# Altium schematic symbol library Regulator_Switching.SchLib: 1120 symbols (part 7 of 8)
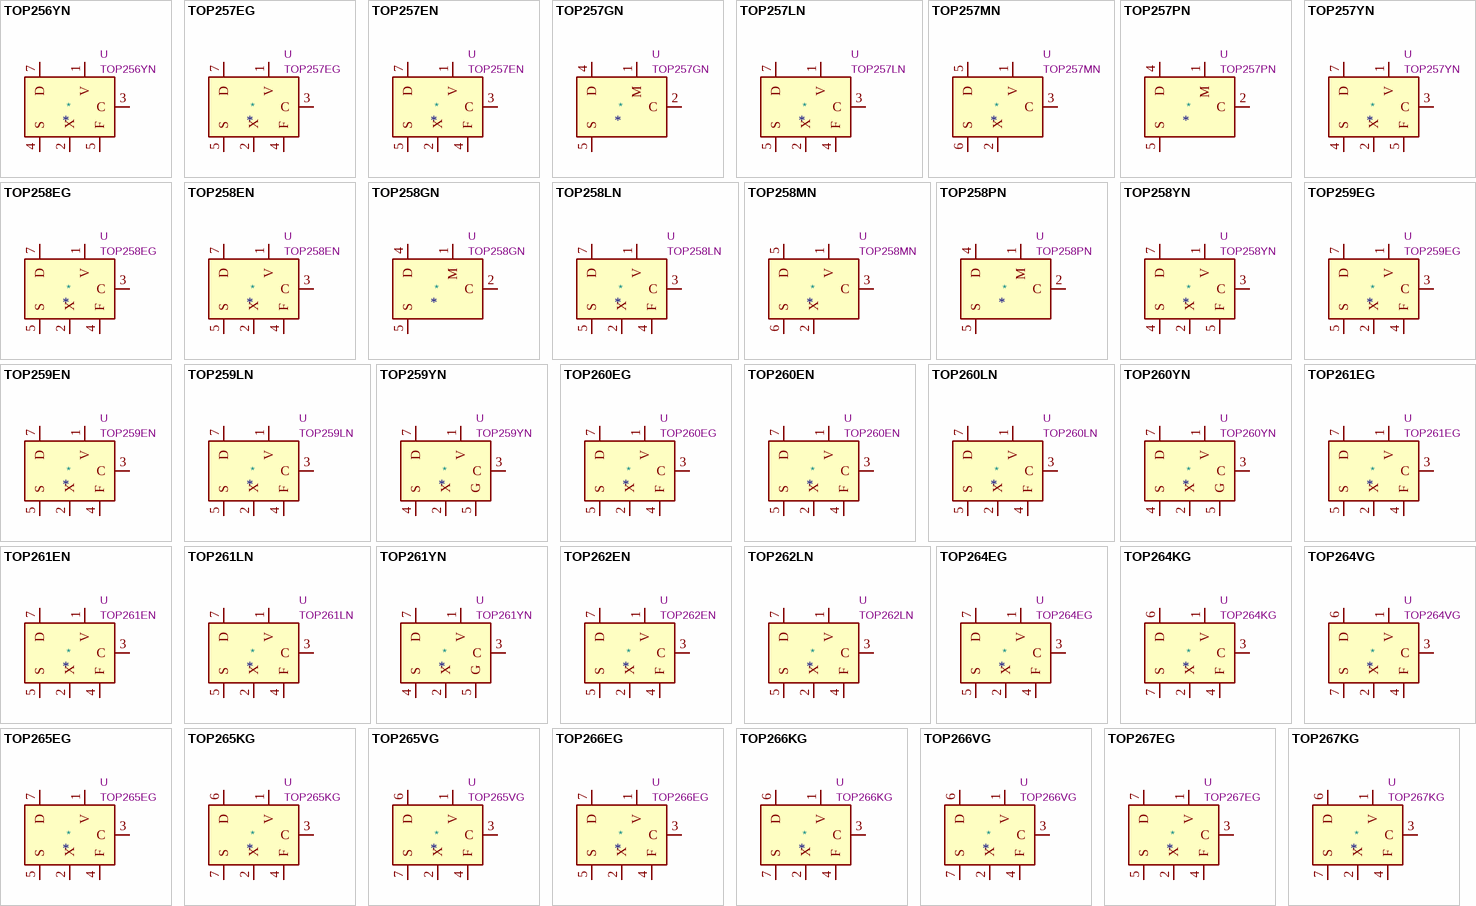
[diagram p33: symbols TOP256YN to TOP267KG]

## TOP256YN
designator *  value TOP256YN  Reference: U
ki_keywords: Eco Smart Off-Line Switcher, Extendend Power Range; ki_description: TOPSwitch-HX Family, 86W Output Power; ki_fp_filters: PowerIntegrations*TO?220?7C*; Footprint: Package_TO_SOT_THT:PowerIntegrations_TO-220-7C; Datasheet: https://ac-dc.power.com/sites/default/files/product-docs/topswitch-hx_family_datasheet.pdf
pins: 1 V, 2 X, 3 C, 4 S, 5 F, 7 D

## TOP257EG
designator *  value TOP257EG  Reference: U
ki_keywords: Eco Smart Off-Line Switcher, Extendend Power Range; ki_description: TOPSwitch-HX Family, 119W Output Power; ki_fp_filters: PowerIntegrations?eSIP?7C*; Footprint: Package_SIP:PowerIntegrations_eSIP-7C; Datasheet: https://ac-dc.power.com/sites/default/files/product-docs/topswitch-hx_family_datasheet.pdf
pins: 1 V, 2 X, 3 C, 4 F, 5 S, 7 D

## TOP257EN
designator *  value TOP257EN  Reference: U
ki_keywords: Eco Smart Off-Line Switcher, Extendend Power Range; ki_description: TOPSwitch-HX Family, 119W Output Power; ki_fp_filters: PowerIntegrations?eSIP?7C*; Footprint: Package_SIP:PowerIntegrations_eSIP-7C; Datasheet: https://ac-dc.power.com/sites/default/files/product-docs/topswitch-hx_family_datasheet.pdf
pins: 1 V, 2 X, 3 C, 4 F, 5 S, 7 D

## TOP257GN
designator *  value TOP257GN  Reference: U
ki_keywords: Eco Smart Off-Line Switcher, Extendend Power Range; ki_description: TOPSwitch-HX Family, 30W Output Power; ki_fp_filters: PowerIntegrations?SMD?8C*; Footprint: Package_DIP:PowerIntegrations_SMD-8C; Datasheet: https://ac-dc.power.com/sites/default/files/product-docs/topswitch-hx_family_datasheet.pdf
pins: 1 M, 2 C, 4 D, 5 S, 6 S hidden, 7 S hidden, 8 S hidden

## TOP257LN
designator *  value TOP257LN  Reference: U
ki_keywords: Eco Smart Off-Line Switcher, Extendend Power Range; ki_description: TOPSwitch-HX Family, 78W Output Power; ki_fp_filters: PowerIntegrations?eSIP?7F*; Footprint: Package_SIP:PowerIntegrations_eSIP-7F; Datasheet: https://ac-dc.power.com/sites/default/files/product-docs/topswitch-hx_family_datasheet.pdf
pins: 1 V, 2 X, 3 C, 4 F, 5 S, 7 D

## TOP257MN
designator *  value TOP257MN  Reference: U
ki_keywords: Eco Smart Off-Line Switcher, Extendend Power Range; ki_description: TOPSwitch-HX Family, 30W Output Power; ki_fp_filters: PowerIntegrations?SDIP?10C*; Footprint: Package_DIP:PowerIntegrations_SDIP-10C; Datasheet: https://ac-dc.power.com/sites/default/files/product-docs/topswitch-hx_family_datasheet.pdf
pins: 1 V, 2 X, 3 C, 5 D, 6 S, 7 S hidden, 8 S hidden, 9 S hidden, 10 S hidden

## TOP257PN
designator *  value TOP257PN  Reference: U
ki_keywords: Eco Smart Off-Line Switcher, Extendend Power Range; ki_description: TOPSwitch-HX Family, 30W Output Power; ki_fp_filters: PowerIntegrations?PDIP?8C*; Footprint: Package_DIP:PowerIntegrations_PDIP-8C; Datasheet: https://ac-dc.power.com/sites/default/files/product-docs/topswitch-hx_family_datasheet.pdf
pins: 1 M, 2 C, 4 D, 5 S, 6 S hidden, 7 S hidden, 8 S hidden

## TOP257YN
designator *  value TOP257YN  Reference: U
ki_keywords: Eco Smart Off-Line Switcher, Extendend Power Range; ki_description: TOPSwitch-HX Family, 119W Output Power; ki_fp_filters: PowerIntegrations*TO?220?7C*; Footprint: Package_TO_SOT_THT:PowerIntegrations_TO-220-7C; Datasheet: https://ac-dc.power.com/sites/default/files/product-docs/topswitch-hx_family_datasheet.pdf
pins: 1 V, 2 X, 3 C, 4 S, 5 F, 7 D

## TOP258EG
designator *  value TOP258EG  Reference: U
ki_keywords: Eco Smart Off-Line Switcher, Extendend Power Range; ki_description: TOPSwitch-HX Family, 148W Output Power; ki_fp_filters: PowerIntegrations?eSIP?7C*; Footprint: Package_SIP:PowerIntegrations_eSIP-7C; Datasheet: https://ac-dc.power.com/sites/default/files/product-docs/topswitch-hx_family_datasheet.pdf
pins: 1 V, 2 X, 3 C, 4 F, 5 S, 7 D

## TOP258EN
designator *  value TOP258EN  Reference: U
ki_keywords: Eco Smart Off-Line Switcher, Extendend Power Range; ki_description: TOPSwitch-HX Family, 148W Output Power; ki_fp_filters: PowerIntegrations?eSIP?7C*; Footprint: Package_SIP:PowerIntegrations_eSIP-7C; Datasheet: https://ac-dc.power.com/sites/default/files/product-docs/topswitch-hx_family_datasheet.pdf
pins: 1 V, 2 X, 3 C, 4 F, 5 S, 7 D

## TOP258GN
designator *  value TOP258GN  Reference: U
ki_keywords: Eco Smart Off-Line Switcher, Extendend Power Range; ki_description: TOPSwitch-HX Family, 35W Output Power; ki_fp_filters: PowerIntegrations?SMD?8C*; Footprint: Package_DIP:PowerIntegrations_SMD-8C; Datasheet: https://ac-dc.power.com/sites/default/files/product-docs/topswitch-hx_family_datasheet.pdf
pins: 1 M, 2 C, 4 D, 5 S, 6 S hidden, 7 S hidden, 8 S hidden

## TOP258LN
designator *  value TOP258LN  Reference: U
ki_keywords: Eco Smart Off-Line Switcher, Extendend Power Range; ki_description: TOPSwitch-HX Family, 92W Output Power; ki_fp_filters: PowerIntegrations?eSIP?7F*; Footprint: Package_SIP:PowerIntegrations_eSIP-7F; Datasheet: https://ac-dc.power.com/sites/default/files/product-docs/topswitch-hx_family_datasheet.pdf
pins: 1 V, 2 X, 3 C, 4 F, 5 S, 7 D

## TOP258MN
designator *  value TOP258MN  Reference: U
ki_keywords: Eco Smart Off-Line Switcher, Extendend Power Range; ki_description: TOPSwitch-HX Family, 35W Output Power; ki_fp_filters: PowerIntegrations?SDIP?10C*; Footprint: Package_DIP:PowerIntegrations_SDIP-10C; Datasheet: https://ac-dc.power.com/sites/default/files/product-docs/topswitch-hx_family_datasheet.pdf
pins: 1 V, 2 X, 3 C, 5 D, 6 S, 7 S hidden, 8 S hidden, 9 S hidden, 10 S hidden

## TOP258PN
designator *  value TOP258PN  Reference: U
ki_keywords: Eco Smart Off-Line Switcher, Extendend Power Range; ki_description: TOPSwitch-HX Family, 35W Output Power; ki_fp_filters: PowerIntegrations?PDIP?8C*; Footprint: Package_DIP:PowerIntegrations_PDIP-8C; Datasheet: https://ac-dc.power.com/sites/default/files/product-docs/topswitch-hx_family_datasheet.pdf
pins: 1 M, 2 C, 4 D, 5 S, 6 S hidden, 7 S hidden, 8 S hidden

## TOP258YN
designator *  value TOP258YN  Reference: U
ki_keywords: Eco Smart Off-Line Switcher, Extendend Power Range; ki_description: TOPSwitch-HX Family, 148W Output Power; ki_fp_filters: PowerIntegrations*TO?220?7C*; Footprint: Package_TO_SOT_THT:PowerIntegrations_TO-220-7C; Datasheet: https://ac-dc.power.com/sites/default/files/product-docs/topswitch-hx_family_datasheet.pdf
pins: 1 V, 2 X, 3 C, 4 S, 5 F, 7 D

## TOP259EG
designator *  value TOP259EG  Reference: U
ki_keywords: Eco Smart Off-Line Switcher, Extendend Power Range; ki_description: TOPSwitch-HX Family, 171W Output Power; ki_fp_filters: PowerIntegrations?eSIP?7C*; Footprint: Package_SIP:PowerIntegrations_eSIP-7C; Datasheet: https://ac-dc.power.com/sites/default/files/product-docs/topswitch-hx_family_datasheet.pdf
pins: 1 V, 2 X, 3 C, 4 F, 5 S, 7 D

## TOP259EN
designator *  value TOP259EN  Reference: U
ki_keywords: Eco Smart Off-Line Switcher, Extendend Power Range; ki_description: TOPSwitch-HX Family, 171W Output Power; ki_fp_filters: PowerIntegrations?eSIP?7C*; Footprint: Package_SIP:PowerIntegrations_eSIP-7C; Datasheet: https://ac-dc.power.com/sites/default/files/product-docs/topswitch-hx_family_datasheet.pdf
pins: 1 V, 2 X, 3 C, 4 F, 5 S, 7 D

## TOP259LN
designator *  value TOP259LN  Reference: U
ki_keywords: Eco Smart Off-Line Switcher, Extendend Power Range; ki_description: TOPSwitch-HX Family, 120W Output Power; ki_fp_filters: PowerIntegrations?eSIP?7F*; Footprint: Package_SIP:PowerIntegrations_eSIP-7F; Datasheet: https://ac-dc.power.com/sites/default/files/product-docs/topswitch-hx_family_datasheet.pdf
pins: 1 V, 2 X, 3 C, 4 F, 5 S, 7 D

## TOP259YN
designator *  value TOP259YN  Reference: U
ki_keywords: Eco Smart Off-Line Switcher, Extendend Power Range; ki_description: TOPSwitch-HX Family, 171W Output Power; ki_fp_filters: PowerIntegrations*TO?220?7C*; Footprint: Package_TO_SOT_THT:PowerIntegrations_TO-220-7C; Datasheet: https://ac-dc.power.com/sites/default/files/product-docs/topswitch-hx_family_datasheet.pdf
pins: 1 V, 2 X, 3 C, 4 S, 5 G, 7 D

## TOP260EG
designator *  value TOP260EG  Reference: U
ki_keywords: Eco Smart Off-Line Switcher, Extendend Power Range; ki_description: TOPSwitch-HX Family, 200W Output Power; ki_fp_filters: PowerIntegrations?eSIP?7C*; Footprint: Package_SIP:PowerIntegrations_eSIP-7C; Datasheet: https://ac-dc.power.com/sites/default/files/product-docs/topswitch-hx_family_datasheet.pdf
pins: 1 V, 2 X, 3 C, 4 F, 5 S, 7 D

## TOP260EN
designator *  value TOP260EN  Reference: U
ki_keywords: Eco Smart Off-Line Switcher, Extendend Power Range; ki_description: TOPSwitch-HX Family, 200W Output Power; ki_fp_filters: PowerIntegrations?eSIP?7C*; Footprint: Package_SIP:PowerIntegrations_eSIP-7C; Datasheet: https://ac-dc.power.com/sites/default/files/product-docs/topswitch-hx_family_datasheet.pdf
pins: 1 V, 2 X, 3 C, 4 F, 5 S, 7 D

## TOP260LN
designator *  value TOP260LN  Reference: U
ki_keywords: Eco Smart Off-Line Switcher, Extendend Power Range; ki_description: TOPSwitch-HX Family, 140W Output Power; ki_fp_filters: PowerIntegrations?eSIP?7F*; Footprint: Package_SIP:PowerIntegrations_eSIP-7F; Datasheet: https://ac-dc.power.com/sites/default/files/product-docs/topswitch-hx_family_datasheet.pdf
pins: 1 V, 2 X, 3 C, 4 F, 5 S, 7 D

## TOP260YN
designator *  value TOP260YN  Reference: U
ki_keywords: Eco Smart Off-Line Switcher, Extendend Power Range; ki_description: TOPSwitch-HX Family, 200W Output Power; ki_fp_filters: PowerIntegrations*TO?220?7C*; Footprint: Package_TO_SOT_THT:PowerIntegrations_TO-220-7C; Datasheet: https://ac-dc.power.com/sites/default/files/product-docs/topswitch-hx_family_datasheet.pdf
pins: 1 V, 2 X, 3 C, 4 S, 5 G, 7 D

## TOP261EG
designator *  value TOP261EG  Reference: U
ki_keywords: Eco Smart Off-Line Switcher, Extendend Power Range; ki_description: TOPSwitch-HX Family, 254W Output Power; ki_fp_filters: PowerIntegrations?eSIP?7C*; Footprint: Package_SIP:PowerIntegrations_eSIP-7C; Datasheet: https://ac-dc.power.com/sites/default/files/product-docs/topswitch-hx_family_datasheet.pdf
pins: 1 V, 2 X, 3 C, 4 F, 5 S, 7 D

## TOP261EN
designator *  value TOP261EN  Reference: U
ki_keywords: Eco Smart Off-Line Switcher, Extendend Power Range; ki_description: TOPSwitch-HX Family, 254W Output Power; ki_fp_filters: PowerIntegrations?eSIP?7C*; Footprint: Package_SIP:PowerIntegrations_eSIP-7C; Datasheet: https://ac-dc.power.com/sites/default/files/product-docs/topswitch-hx_family_datasheet.pdf
pins: 1 V, 2 X, 3 C, 4 F, 5 S, 7 D

## TOP261LN
designator *  value TOP261LN  Reference: U
ki_keywords: Eco Smart Off-Line Switcher, Extendend Power Range; ki_description: TOPSwitch-HX Family, 177W Output Power; ki_fp_filters: PowerIntegrations?eSIP?7F*; Footprint: Package_SIP:PowerIntegrations_eSIP-7F; Datasheet: https://ac-dc.power.com/sites/default/files/product-docs/topswitch-hx_family_datasheet.pdf
pins: 1 V, 2 X, 3 C, 4 F, 5 S, 7 D

## TOP261YN
designator *  value TOP261YN  Reference: U
ki_keywords: Eco Smart Off-Line Switcher, Extendend Power Range; ki_description: TOPSwitch-HX Family, 254W Output Power; ki_fp_filters: PowerIntegrations*TO?220?7C*; Footprint: Package_TO_SOT_THT:PowerIntegrations_TO-220-7C; Datasheet: https://ac-dc.power.com/sites/default/files/product-docs/topswitch-hx_family_datasheet.pdf
pins: 1 V, 2 X, 3 C, 4 S, 5 G, 7 D

## TOP262EN
designator *  value TOP262EN  Reference: U
ki_keywords: Eco Smart Off-Line Switcher, Extendend Power Range; ki_description: TOPSwitch-HX Family, 254W Output Power; ki_fp_filters: PowerIntegrations?eSIP?7C*; Footprint: Package_SIP:PowerIntegrations_eSIP-7C; Datasheet: https://ac-dc.power.com/sites/default/files/product-docs/topswitch-hx_family_datasheet.pdf
pins: 1 V, 2 X, 3 C, 4 F, 5 S, 7 D

## TOP262LN
designator *  value TOP262LN  Reference: U
ki_keywords: Eco Smart Off-Line Switcher, Extendend Power Range; ki_description: TOPSwitch-HX Family, 177W Output Power; ki_fp_filters: PowerIntegrations?eSIP?7F*; Footprint: Package_SIP:PowerIntegrations_eSIP-7F; Datasheet: https://ac-dc.power.com/sites/default/files/product-docs/topswitch-hx_family_datasheet.pdf
pins: 1 V, 2 X, 3 C, 4 F, 5 S, 7 D

## TOP264EG
designator *  value TOP264EG  Reference: U
ki_keywords: Integrated Off-Line Switcher with EcoSmart™ Technology; ki_description: TOPSwitch-JX Family, 43W Output Power, eSIP-7C; ki_fp_filters: PowerIntegrations?eSIP?7C*; Footprint: Package_SIP:PowerIntegrations_eSIP-7C; Datasheet: https://ac-dc.power.com/sites/default/files/product-docs/topswitch-jx_family_datasheet.pdf
pins: 1 V, 2 X, 3 C, 4 F, 5 S, 7 D

## TOP264KG
designator *  value TOP264KG  Reference: U
ki_keywords: Integrated Off-Line Switcher with EcoSmart™ Technology; ki_description: TOPSwitch-JX Family, 30W Output Power, eSOP-12B; ki_fp_filters: PowerIntegrations?eSOP?12B*; Footprint: Package_SO:PowerIntegrations_eSOP-12B; Datasheet: https://ac-dc.power.com/sites/default/files/product-docs/topswitch-jx_family_datasheet.pdf
pins: 1 V, 2 X, 3 C, 4 F, 6 D, 7 S, 8 S hidden, 9 S hidden, 10 S hidden, 11 S hidden, 12 S hidden

## TOP264VG
designator *  value TOP264VG  Reference: U
ki_keywords: Integrated Off-Line Switcher with EcoSmart™ Technology; ki_description: TOPSwitch-JX Family, 43W Output Power, eDIP-12B; ki_fp_filters: PowerIntegrations?eDIP?12*; Footprint: Package_DIP:PowerIntegrations_eDIP-12B; Datasheet: https://ac-dc.power.com/sites/default/files/product-docs/topswitch-jx_family_datasheet.pdf
pins: 1 V, 2 X, 3 C, 4 F, 6 D, 7 S, 8 S hidden, 9 S hidden, 10 S hidden, 11 S hidden, 12 S hidden

## TOP265EG
designator *  value TOP265EG  Reference: U
ki_keywords: Integrated Off-Line Switcher with EcoSmart™ Technology; ki_description: TOPSwitch-JX Family, 57W Output Power, eSIP-7C; ki_fp_filters: PowerIntegrations?eSIP?7C*; Footprint: Package_SIP:PowerIntegrations_eSIP-7C; Datasheet: https://ac-dc.power.com/sites/default/files/product-docs/topswitch-jx_family_datasheet.pdf
pins: 1 V, 2 X, 3 C, 4 F, 5 S, 7 D

## TOP265KG
designator *  value TOP265KG  Reference: U
ki_keywords: Integrated Off-Line Switcher with EcoSmart™ Technology; ki_description: TOPSwitch-JX Family, 34W Output Power, eSOP-12B; ki_fp_filters: PowerIntegrations?eSOP?12B*; Footprint: Package_SO:PowerIntegrations_eSOP-12B; Datasheet: https://ac-dc.power.com/sites/default/files/product-docs/topswitch-jx_family_datasheet.pdf
pins: 1 V, 2 X, 3 C, 4 F, 6 D, 7 S, 8 S hidden, 9 S hidden, 10 S hidden, 11 S hidden, 12 S hidden

## TOP265VG
designator *  value TOP265VG  Reference: U
ki_keywords: Integrated Off-Line Switcher with EcoSmart™ Technology; ki_description: TOPSwitch-JX Family, 57W Output Power, eDIP-12B; ki_fp_filters: PowerIntegrations?eDIP?12*; Footprint: Package_DIP:PowerIntegrations_eDIP-12B; Datasheet: https://ac-dc.power.com/sites/default/files/product-docs/topswitch-jx_family_datasheet.pdf
pins: 1 V, 2 X, 3 C, 4 F, 6 D, 7 S, 8 S hidden, 9 S hidden, 10 S hidden, 11 S hidden, 12 S hidden

## TOP266EG
designator *  value TOP266EG  Reference: U
ki_keywords: Integrated Off-Line Switcher with EcoSmart™ Technology; ki_description: TOPSwitch-JX Family, 86W Output Power, eSIP-7C; ki_fp_filters: PowerIntegrations?eSIP?7C*; Footprint: Package_SIP:PowerIntegrations_eSIP-7C; Datasheet: https://ac-dc.power.com/sites/default/files/product-docs/topswitch-jx_family_datasheet.pdf
pins: 1 V, 2 X, 3 C, 4 F, 5 S, 7 D

## TOP266KG
designator *  value TOP266KG  Reference: U
ki_keywords: Integrated Off-Line Switcher with EcoSmart™ Technology; ki_description: TOPSwitch-JX Family, 39W Output Power, eSOP-12B; ki_fp_filters: PowerIntegrations?eSOP?12B*; Footprint: Package_SO:PowerIntegrations_eSOP-12B; Datasheet: https://ac-dc.power.com/sites/default/files/product-docs/topswitch-jx_family_datasheet.pdf
pins: 1 V, 2 X, 3 C, 4 F, 6 D, 7 S, 8 S hidden, 9 S hidden, 10 S hidden, 11 S hidden, 12 S hidden

## TOP266VG
designator *  value TOP266VG  Reference: U
ki_keywords: Integrated Off-Line Switcher with EcoSmart™ Technology; ki_description: TOPSwitch-JX Family, 86W Output Power, eDIP-12B; ki_fp_filters: PowerIntegrations?eDIP?12*; Footprint: Package_DIP:PowerIntegrations_eDIP-12B; Datasheet: https://ac-dc.power.com/sites/default/files/product-docs/topswitch-jx_family_datasheet.pdf
pins: 1 V, 2 X, 3 C, 4 F, 6 D, 7 S, 8 S hidden, 9 S hidden, 10 S hidden, 11 S hidden, 12 S hidden

## TOP267EG
designator *  value TOP267EG  Reference: U
ki_keywords: Integrated Off-Line Switcher with EcoSmart™ Technology; ki_description: TOPSwitch-JX Family, 103W Output Power, eSIP-7C; ki_fp_filters: PowerIntegrations?eSIP?7C*; Footprint: Package_SIP:PowerIntegrations_eSIP-7C; Datasheet: https://ac-dc.power.com/sites/default/files/product-docs/topswitch-jx_family_datasheet.pdf
pins: 1 V, 2 X, 3 C, 4 F, 5 S, 7 D

## TOP267KG
designator *  value TOP267KG  Reference: U
ki_keywords: Integrated Off-Line Switcher with EcoSmart™ Technology; ki_description: TOPSwitch-JX Family, 45W Output Power, eSOP-12B; ki_fp_filters: PowerIntegrations?eSOP?12B*; Footprint: Package_SO:PowerIntegrations_eSOP-12B; Datasheet: https://ac-dc.power.com/sites/default/files/product-docs/topswitch-jx_family_datasheet.pdf
pins: 1 V, 2 X, 3 C, 4 F, 6 D, 7 S, 8 S hidden, 9 S hidden, 10 S hidden, 11 S hidden, 12 S hidden

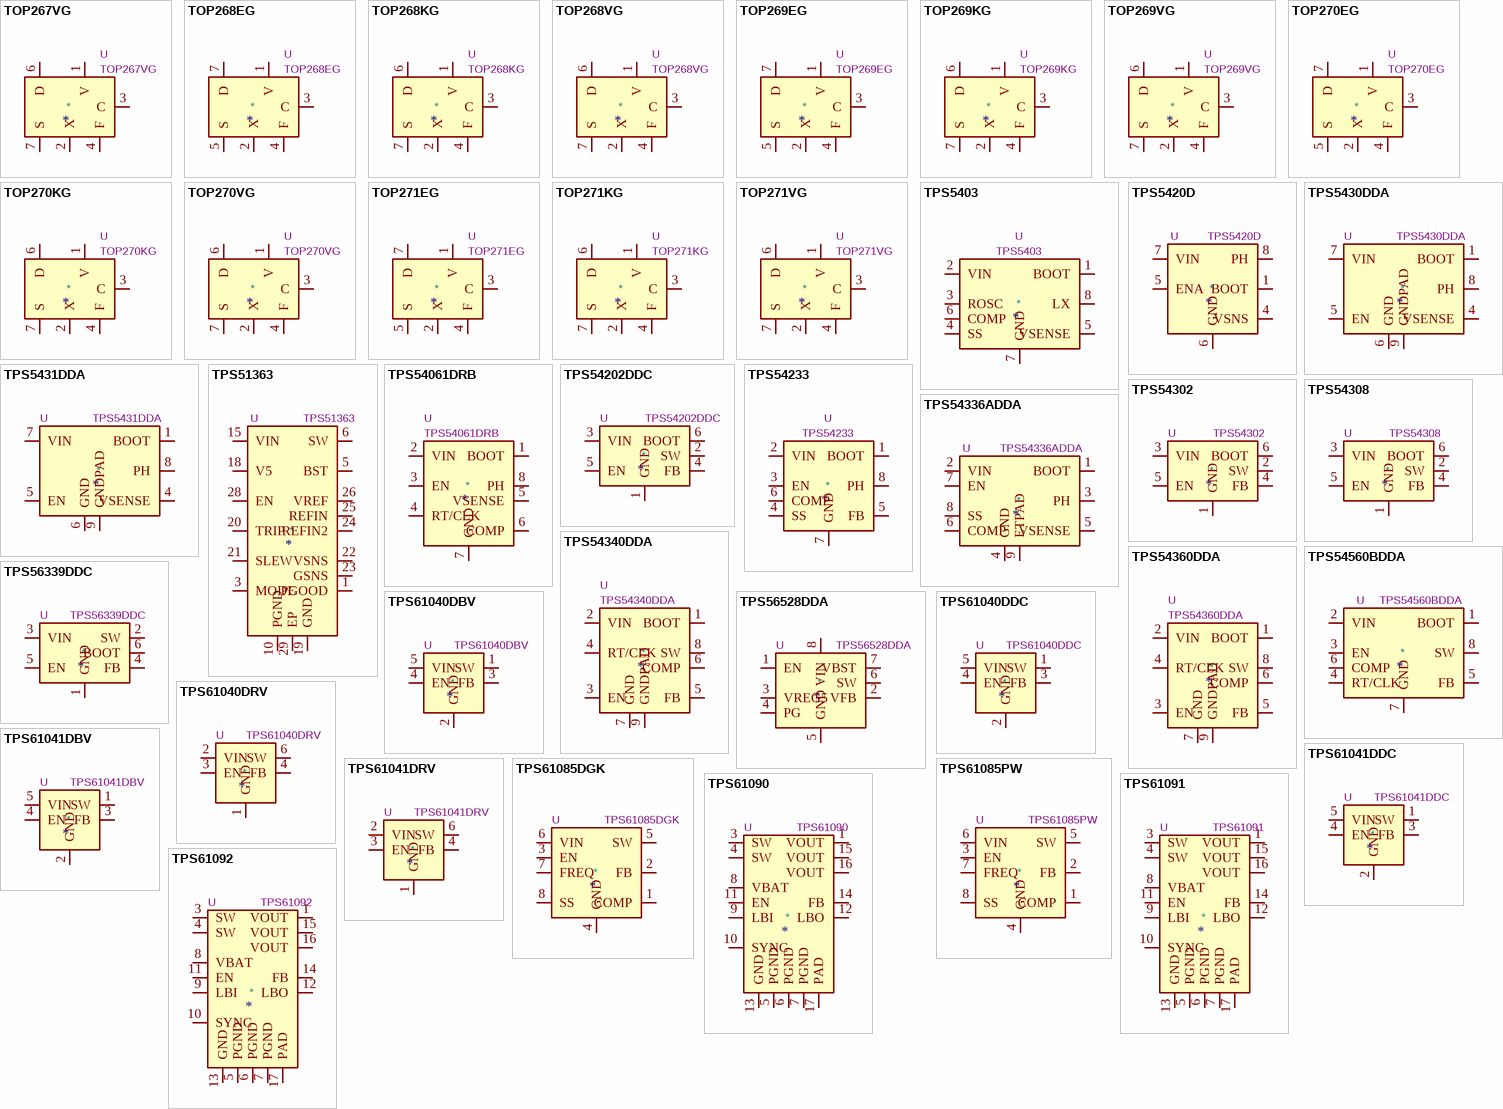
[diagram p24: symbols TOP267VG to TPS61092]

## TOP267VG
designator *  value TOP267VG  Reference: U
ki_keywords: Integrated Off-Line Switcher with EcoSmart™ Technology; ki_description: TOPSwitch-JX Family, 103W Output Power, eDIP-12B; ki_fp_filters: PowerIntegrations?eDIP?12*; Footprint: Package_DIP:PowerIntegrations_eDIP-12B; Datasheet: https://ac-dc.power.com/sites/default/files/product-docs/topswitch-jx_family_datasheet.pdf
pins: 1 V, 2 X, 3 C, 4 F, 6 D, 7 S, 8 S hidden, 9 S hidden, 10 S hidden, 11 S hidden, 12 S hidden

## TOP268EG
designator *  value TOP268EG  Reference: U
ki_keywords: Integrated Off-Line Switcher with EcoSmart™ Technology; ki_description: TOPSwitch-JX Family, 112W Output Power, eSIP-7C; ki_fp_filters: PowerIntegrations?eSIP?7C*; Footprint: Package_SIP:PowerIntegrations_eSIP-7C; Datasheet: https://ac-dc.power.com/sites/default/files/product-docs/topswitch-jx_family_datasheet.pdf
pins: 1 V, 2 X, 3 C, 4 F, 5 S, 7 D

## TOP268KG
designator *  value TOP268KG  Reference: U
ki_keywords: Integrated Off-Line Switcher with EcoSmart™ Technology; ki_description: TOPSwitch-JX Family, 50W Output Power, eSOP-12B; ki_fp_filters: PowerIntegrations?eSOP?12B*; Footprint: Package_SO:PowerIntegrations_eSOP-12B; Datasheet: https://ac-dc.power.com/sites/default/files/product-docs/topswitch-jx_family_datasheet.pdf
pins: 1 V, 2 X, 3 C, 4 F, 6 D, 7 S, 8 S hidden, 9 S hidden, 10 S hidden, 11 S hidden, 12 S hidden

## TOP268VG
designator *  value TOP268VG  Reference: U
ki_keywords: Integrated Off-Line Switcher with EcoSmart™ Technology; ki_description: TOPSwitch-JX Family, 112W Output Power, eDIP-12B; ki_fp_filters: PowerIntegrations?eDIP?12*; Footprint: Package_DIP:PowerIntegrations_eDIP-12B; Datasheet: https://ac-dc.power.com/sites/default/files/product-docs/topswitch-jx_family_datasheet.pdf
pins: 1 V, 2 X, 3 C, 4 F, 6 D, 7 S, 8 S hidden, 9 S hidden, 10 S hidden, 11 S hidden, 12 S hidden

## TOP269EG
designator *  value TOP269EG  Reference: U
ki_keywords: Integrated Off-Line Switcher with EcoSmart™ Technology; ki_description: TOPSwitch-JX Family, 120W Output Power, eSIP-7C; ki_fp_filters: PowerIntegrations?eSIP?7C*; Footprint: Package_SIP:PowerIntegrations_eSIP-7C; Datasheet: https://ac-dc.power.com/sites/default/files/product-docs/topswitch-jx_family_datasheet.pdf
pins: 1 V, 2 X, 3 C, 4 F, 5 S, 7 D

## TOP269KG
designator *  value TOP269KG  Reference: U
ki_keywords: Integrated Off-Line Switcher with EcoSmart™ Technology; ki_description: TOPSwitch-JX Family, 55W Output Power, eSOP-12B; ki_fp_filters: PowerIntegrations?eSOP?12B*; Footprint: Package_SO:PowerIntegrations_eSOP-12B; Datasheet: https://ac-dc.power.com/sites/default/files/product-docs/topswitch-jx_family_datasheet.pdf
pins: 1 V, 2 X, 3 C, 4 F, 6 D, 7 S, 8 S hidden, 9 S hidden, 10 S hidden, 11 S hidden, 12 S hidden

## TOP269VG
designator *  value TOP269VG  Reference: U
ki_keywords: Integrated Off-Line Switcher with EcoSmart™ Technology; ki_description: TOPSwitch-JX Family, 120W Output Power, eDIP-12B; ki_fp_filters: PowerIntegrations?eDIP?12*; Footprint: Package_DIP:PowerIntegrations_eDIP-12B; Datasheet: https://ac-dc.power.com/sites/default/files/product-docs/topswitch-jx_family_datasheet.pdf
pins: 1 V, 2 X, 3 C, 4 F, 6 D, 7 S, 8 S hidden, 9 S hidden, 10 S hidden, 11 S hidden, 12 S hidden

## TOP270EG
designator *  value TOP270EG  Reference: U
ki_keywords: Integrated Off-Line Switcher with EcoSmart™ Technology; ki_description: TOPSwitch-JX Family, 140W Output Power, eSIP-7C; ki_fp_filters: PowerIntegrations?eSIP?7C*; Footprint: Package_SIP:PowerIntegrations_eSIP-7C; Datasheet: https://ac-dc.power.com/sites/default/files/product-docs/topswitch-jx_family_datasheet.pdf
pins: 1 V, 2 X, 3 C, 4 F, 5 S, 7 D

## TOP270KG
designator *  value TOP270KG  Reference: U
ki_keywords: Integrated Off-Line Switcher with EcoSmart™ Technology; ki_description: TOPSwitch-JX Family, 60W Output Power, eSOP-12B; ki_fp_filters: PowerIntegrations?eSOP?12B*; Footprint: Package_SO:PowerIntegrations_eSOP-12B; Datasheet: https://ac-dc.power.com/sites/default/files/product-docs/topswitch-jx_family_datasheet.pdf
pins: 1 V, 2 X, 3 C, 4 F, 6 D, 7 S, 8 S hidden, 9 S hidden, 10 S hidden, 11 S hidden, 12 S hidden

## TOP270VG
designator *  value TOP270VG  Reference: U
ki_keywords: Integrated Off-Line Switcher with EcoSmart™ Technology; ki_description: TOPSwitch-JX Family, 140W Output Power, eDIP-12B; ki_fp_filters: PowerIntegrations?eDIP?12*; Footprint: Package_DIP:PowerIntegrations_eDIP-12B; Datasheet: https://ac-dc.power.com/sites/default/files/product-docs/topswitch-jx_family_datasheet.pdf
pins: 1 V, 2 X, 3 C, 4 F, 6 D, 7 S, 8 S hidden, 9 S hidden, 10 S hidden, 11 S hidden, 12 S hidden

## TOP271EG
designator *  value TOP271EG  Reference: U
ki_keywords: Integrated Off-Line Switcher with EcoSmart™ Technology; ki_description: TOPSwitch-JX Family, 177W Output Power, eSIP-7C; ki_fp_filters: PowerIntegrations?eSIP?7C*; Footprint: Package_SIP:PowerIntegrations_eSIP-7C; Datasheet: https://ac-dc.power.com/sites/default/files/product-docs/topswitch-jx_family_datasheet.pdf
pins: 1 V, 2 X, 3 C, 4 F, 5 S, 7 D

## TOP271KG
designator *  value TOP271KG  Reference: U
ki_keywords: Integrated Off-Line Switcher with EcoSmart™ Technology; ki_description: TOPSwitch-JX Family, 66W Output Power, eSOP-12B; ki_fp_filters: PowerIntegrations?eSOP?12B*; Footprint: Package_SO:PowerIntegrations_eSOP-12B; Datasheet: https://ac-dc.power.com/sites/default/files/product-docs/topswitch-jx_family_datasheet.pdf
pins: 1 V, 2 X, 3 C, 4 F, 6 D, 7 S, 8 S hidden, 9 S hidden, 10 S hidden, 11 S hidden, 12 S hidden

## TOP271VG
designator *  value TOP271VG  Reference: U
ki_keywords: Integrated Off-Line Switcher with EcoSmart™ Technology; ki_description: TOPSwitch-JX Family, 177W Output Power, eDIP-12B; ki_fp_filters: PowerIntegrations?eDIP?12*; Footprint: Package_DIP:PowerIntegrations_eDIP-12B; Datasheet: https://ac-dc.power.com/sites/default/files/product-docs/topswitch-jx_family_datasheet.pdf
pins: 1 V, 2 X, 3 C, 4 F, 6 D, 7 S, 8 S hidden, 9 S hidden, 10 S hidden, 11 S hidden, 12 S hidden

## TPS5403
designator *  value TPS5403  Reference: U
ki_keywords: Step-Down DC-DC Switching Regulator; ki_description: 4.5-28V In, 3.3V Out, 1.7A, SOIC-8; ki_fp_filters: SOIC*3.9x4.9mm*; Footprint: Package_SO:SOIC-8_3.9x4.9mm_P1.27mm; Datasheet: https://www.ti.com/lit/ds/symlink/tps5403.pdf
pins: 1 BOOT, 2 VIN, 3 ROSC, 4 SS, 5 VSENSE, 6 COMP, 7 GND, 8 LX

## TPS5420D
designator *  value TPS5420D  Reference: U
ki_keywords: switching buck converter step-down; ki_description: Adjustable Output, 2A Step-Down Converter, 5.5V-36V Input, 500kHz Switching Frequency; ki_fp_filters: SOIC*3.9x4.9mm*P1.27mm*; Footprint: Package_SO:SOIC-8_3.9x4.9mm_P1.27mm; Datasheet: http://www.ti.com/lit/ds/symlink/tps5420.pdf
pins: 1 BOOT, 2 NC hidden, 3 NC hidden, 4 VSNS, 5 ENA, 6 GND, 7 VIN, 8 PH

## TPS5430DDA
designator *  value TPS5430DDA  Reference: U
ki_keywords: Step-Down DC-DC Switching Regulator; ki_description: 3A, Step Down Swift Converter, Adjustable Output Voltage, 5.5-36V Input Voltage, PowerSO-8; ki_fp_filters: TI*SO*PowerPAD*ThermalVias*; Footprint: Package_SO:TI_SO-PowerPAD-8_ThermalVias; Datasheet: http://www.ti.com/lit/ds/symlink/tps5430.pdf
pins: 1 BOOT, 2 NC hidden, 3 NC hidden, 4 VSENSE, 5 EN, 6 GND, 7 VIN, 8 PH, 9 GNDPAD

## TPS5431DDA
designator *  value TPS5431DDA  Reference: U
ki_keywords: Step-Down DC-DC Switching Regulator; ki_description: 3A, Step Down Swift Converter, Adjustable Output Voltage, 5.5-23V Input Voltage, PowerSO-8; ki_fp_filters: TI*SO*PowerPAD*ThermalVias*; Footprint: Package_SO:TI_SO-PowerPAD-8_ThermalVias; Datasheet: http://www.ti.com/lit/ds/symlink/tps5430.pdf
pins: 1 BOOT, 2 NC hidden, 3 NC hidden, 4 VSENSE, 5 EN, 6 GND, 7 VIN, 8 PH, 9 GNDPAD

## TPS51363
designator *  value TPS51363  Reference: U
ki_keywords: Step-down; ki_description: High-voltage input, synchronous converter with integrated FET, QFN-28; ki_fp_filters: *QFN*EP2.1x3.1mm*; Footprint: Package_DFN_QFN:Texas_R-PWQFN-N28_EP2.1x3.1mm; Datasheet: http://www.ti.com/lit/ds/symlink/tps51363.pdf
pins: 1 PGOOD, 2 NU hidden, 3 MODE, 4 NC hidden, 5 BST, 6 SW, 7 SW hidden, 8 SW hidden, 9 SW hidden, 10 PGND, 11 PGND hidden, 12 PGND hidden, 13 PGND hidden, 14 PGND hidden, 15 VIN, 16 VIN hidden, 17 VIN hidden, 18 V5, 19 GND, 20 TRIP, 21 SLEW, 22 VSNS, 23 GSNS, 24 REFIN2, 25 REFIN, 26 VREF, 27 NU hidden, 28 EN, 29 EP

## TPS54061DRB
designator *  value TPS54061DRB  Reference: U
ki_keywords: Step-Down DC-DC Switching Regulator High Voltage Adjustable Frequency; ki_description: 0.2A, Step Down DC-DC Converter with Low IQ, 4.5-60V Input Voltage, VSON-8; ki_fp_filters: Texas*S*PVSON*; Footprint: Package_SON:Texas_S-PVSON-N8; Datasheet: http://www.ti.com/lit/ds/symlink/tps54061.pdf
pins: 1 BOOT, 2 VIN, 3 EN, 4 RT/CLK, 5 VSENSE, 6 COMP, 7 GND, 8 PH, 9 GND hidden

## TPS54202DDC
designator *  value TPS54202DDC  Reference: U
ki_keywords: switching buck converter power-supply voltage regulator emi spread spectrum; ki_description: 2A, 4.5 to 28V Input, EMI Friendly integrated switch synchronous step-down regulator, pulse-skipping, SOT-23-6; ki_fp_filters: SOT?23*; Footprint: Package_TO_SOT_SMD:SOT-23-6; Datasheet: http://www.ti.com/lit/ds/symlink/tps54202.pdf
pins: 1 GND, 2 SW, 3 VIN, 4 FB, 5 EN, 6 BOOT

## TPS54233
designator *  value TPS54233  Reference: U
ki_keywords: Step-Down DC-DC Switching Regulator High Voltage High Frequency; ki_description: 2A, Step Down DC-DC Converter with Eco-mode, 3.5-28V Input Voltage, SO-8; ki_fp_filters: SOIC*3.9x4.9mm*; Footprint: Package_SO:SOIC-8_3.9x4.9mm_P1.27mm; Datasheet: http://www.ti.com/lit/ds/symlink/tps54233.pdf
pins: 1 BOOT, 2 VIN, 3 EN, 4 SS, 5 FB, 6 COMP, 7 GND, 8 PH

## TPS54302
designator *  value TPS54302  Reference: U
ki_keywords: switching buck converter power-supply voltage regulator emi spread spectrum; ki_description: 3A, 4.5 to 28V Input, EMI Friendly integrated switch synchronous step-down regulator, pulse-skipping, SOT-23-6; ki_fp_filters: SOT?23*; Footprint: Package_TO_SOT_SMD:SOT-23-6; Datasheet: http://www.ti.com/lit/ds/symlink/tps54302.pdf
pins: 1 GND, 2 SW, 3 VIN, 4 FB, 5 EN, 6 BOOT

## TPS54308
designator *  value TPS54308  Reference: U
ki_keywords: switching buck converter power-supply voltage regulator emi spread spectrum FCCM; ki_description: 3A, 4.5 to 28V Input, EMI Friendly integrated switch synchronous step-down regulator, continuous-conduction, SOT-23-6; ki_fp_filters: SOT?23*; Footprint: Package_TO_SOT_SMD:SOT-23-6; Datasheet: http://www.ti.com/lit/ds/symlink/tps54308.pdf
pins: 1 GND, 2 SW, 3 VIN, 4 FB, 5 EN, 6 BOOT

## TPS54336ADDA
designator *  value TPS54336ADDA  Reference: U
ki_keywords: Step-Down DC-DC Switching Regulator; ki_description: 4.5V to 28V Input, 3A, Synchronous Step-Down Converter with Eco-mode(tm); ki_fp_filters: TI*SO*PowerPAD*ThermalVias*; Footprint: Package_SO:TI_SO-PowerPAD-8_ThermalVias; Datasheet: http://www.ti.com/lit/ds/symlink/tps54336a.pdf
pins: 1 BOOT, 2 VIN, 3 PH, 4 GND, 5 VSENSE, 6 COMP, 7 EN, 8 SS, 9 ETPAD

## TPS54340DDA
designator *  value TPS54340DDA  Reference: U
ki_keywords: Step-Down DC-DC Switching Regulator High Voltage High Frequency; ki_description: 3.5A, Step Down DC-DC Converter with Eco-mode, 4.5-42V Input Voltage, PowerSO-8; ki_fp_filters: TI*SO*PowerPAD*ThermalVias*; Footprint: Package_SO:TI_SO-PowerPAD-8_ThermalVias; Datasheet: http://www.ti.com/lit/ds/symlink/tps54340.pdf
pins: 1 BOOT, 2 VIN, 3 EN, 4 RT/CLK, 5 FB, 6 COMP, 7 GND, 8 SW, 9 GNDPAD

## TPS54360DDA
designator *  value TPS54360DDA  Reference: U
ki_keywords: Step-Down DC-DC Switching Regulator High Voltage High Frequency; ki_description: 3.5A, Step Down DC-DC Converter with Eco-mode, 4.5-60V Input Voltage, PowerSO-8; ki_fp_filters: TI*SO*PowerPAD*ThermalVias*; Footprint: Package_SO:TI_SO-PowerPAD-8_ThermalVias; Datasheet: http://www.ti.com/lit/ds/symlink/tps54360.pdf
pins: 1 BOOT, 2 VIN, 3 EN, 4 RT/CLK, 5 FB, 6 COMP, 7 GND, 8 SW, 9 GNDPAD

## TPS54560BDDA
designator *  value TPS54560BDDA  Reference: U
ki_keywords: buck controller; ki_description: 5A, Step Down DC-DC Converter, 4.5-60V Input Voltage, Texas R-PDSO-G8; ki_fp_filters: Texas*R*PDSO*G8*; Footprint: Package_SO:Texas_R-PDSO-G8_EP2.95x4.9mm_Mask2.4x3.1mm_ThermalVias; Datasheet: https://www.ti.com/lit/ds/symlink/tps54560b.pdf
pins: 1 BOOT, 2 VIN, 3 EN, 4 RT/CLK, 5 FB, 6 COMP, 7 GND, 8 SW, 9 GND hidden

## TPS56339DDC
designator *  value TPS56339DDC  Reference: U
ki_keywords: step-down dcdc voltage regulator; ki_description: 4.5V to 24V Input, 3-A Output Synchronous Buck Converter, SOT-23-6; ki_fp_filters: SOT?23*; Footprint: Package_TO_SOT_SMD:SOT-23-6; Datasheet: https://www.ti.com/lit/ds/symlink/tps56339.pdf
pins: 1 GND, 2 SW, 3 VIN, 4 FB, 5 EN, 6 BOOT

## TPS56528DDA
designator *  value TPS56528DDA  Reference: U
ki_keywords: step-down dcdc voltage regulator; ki_description: 5A Synchronous Step-Down Voltage Regulator, Adjustable Output Voltage 0.6-7V, 4.5-18V Input Voltage, SO-8EP; ki_fp_filters: Texas*HSOP*1EP*; Footprint: Package_SO:Texas_HSOP-8-1EP_3.9x4.9mm_P1.27mm_ThermalVias; Datasheet: https://www.ti.com/lit/ds/symlink/tps56528.pdf
pins: 1 EN, 2 VFB, 3 VREG5, 4 PG, 5 GND, 6 SW, 7 VBST, 8 VIN, 9 GND hidden

## TPS61040DBV
designator *  value TPS61040DBV  Reference: U
ki_keywords: Step-Up Boost DC-DC Regulator Adjustable; ki_description: Synchronous Boost Regulator, Adjustable Output up to 28V, 400 mA Switch Current Limit, SOT-23-5; ki_fp_filters: SOT?23*; Footprint: Package_TO_SOT_SMD:SOT-23-5; Datasheet: http://www.ti.com/lit/ds/symlink/tps61040.pdf
pins: 1 SW, 2 GND, 3 FB, 4 EN, 5 VIN

## TPS61040DDC
designator *  value TPS61040DDC  Reference: U
ki_keywords: Step-Up Boost DC-DC Regulator Adjustable; ki_description: Synchronous Boost Regulator, Adjustable Output up to 28V, 400 mA Switch Current Limit, SOT-23-5; ki_fp_filters: SOT?23*; Footprint: Package_TO_SOT_SMD:SOT-23-5; Datasheet: https://www.ti.com/lit/ds/symlink/tps61040.pdf
pins: 1 SW, 2 GND, 3 FB, 4 EN, 5 VIN

## TPS61040DRV
designator *  value TPS61040DRV  Reference: U
ki_keywords: Step-Up Boost DC-DC Regulator Adjustable; ki_description: Synchronous Boost Regulator, Adjustable Output up to 28V, 400 mA Switch Current Limit, WSON-6; ki_fp_filters: WSON*1EP*2x2mm*P0.65mm*; Footprint: Package_SON:WSON-6-1EP_2x2mm_P0.65mm_EP1x1.6mm; Datasheet: https://www.ti.com/lit/ds/symlink/tps61040.pdf
pins: 1 GND, 2 VIN, 3 EN, 4 FB, 5 NC hidden, 6 SW

## TPS61041DBV
designator *  value TPS61041DBV  Reference: U
ki_keywords: Step-Up Boost DC-DC Regulator Adjustable; ki_description: Synchronous Boost Regulator, Adjustable Output up to 28V, 250 mA Switch Current Limit, SOT-23-5; ki_fp_filters: SOT?23*; Footprint: Package_TO_SOT_SMD:SOT-23-5; Datasheet: http://www.ti.com/lit/ds/symlink/tps61040.pdf
pins: 1 SW, 2 GND, 3 FB, 4 EN, 5 VIN

## TPS61041DDC
designator *  value TPS61041DDC  Reference: U
ki_keywords: Step-Up Boost DC-DC Regulator Adjustable; ki_description: Synchronous Boost Regulator, Adjustable Output up to 28V, 250 mA Switch Current Limit, SOT-23-5; ki_fp_filters: SOT?23*; Footprint: Package_TO_SOT_SMD:SOT-23-5; Datasheet: http://www.ti.com/lit/ds/symlink/tps61040.pdf
pins: 1 SW, 2 GND, 3 FB, 4 EN, 5 VIN

## TPS61041DRV
designator *  value TPS61041DRV  Reference: U
ki_keywords: Step-Up Boost DC-DC Regulator Adjustable; ki_description: Synchronous Boost Regulator, Adjustable Output up to 28V, 250 mA Switch Current Limit, WSON-6; ki_fp_filters: WSON*1EP*2x2mm*P0.65mm*; Footprint: Package_SON:WSON-6-1EP_2x2mm_P0.65mm_EP1x1.6mm; Datasheet: http://www.ti.com/lit/ds/symlink/tps61040.pdf
pins: 1 GND, 2 VIN, 3 EN, 4 FB, 5 NC hidden, 6 SW

## TPS61085DGK
designator *  value TPS61085DGK  Reference: U
ki_keywords: boost converter switching VSSOP-8; ki_description: Step-Up DC-DC Converter, input 2.3V to 6V , output 2.8V to 18.5, VSSOP-8; ki_fp_filters: VSSOP*3.0x3.0mm*P0.65mm*; Footprint: Package_SO:VSSOP-8_3.0x3.0mm_P0.65mm; Datasheet: https://www.ti.com/lit/ds/symlink/tps61085.pdf
pins: 1 COMP, 2 FB, 3 EN, 4 GND, 5 SW, 6 VIN, 7 FREQ, 8 SS

## TPS61085PW
designator *  value TPS61085PW  Reference: U
ki_keywords: boost converter switching TSSOP-8; ki_description: Step-Up DC-DC Converter, input 2.3V to 6V , output 2.8V to 18.5, TSSOP-8; ki_fp_filters: TSSOP*4.4x3mm*P0.65mm*; Footprint: Package_SO:TSSOP-8_4.4x3mm_P0.65mm; Datasheet: https://www.ti.com/lit/ds/symlink/tps61085.pdf
pins: 1 COMP, 2 FB, 3 EN, 4 GND, 5 SW, 6 VIN, 7 FREQ, 8 SS

## TPS61090
designator *  value TPS61090  Reference: U
ki_keywords: Adjustable 2A battery boost converter; ki_description: 2A Step-Up DC-DC Converter for Batteries, Isw up to 2500mA, Adjustable output voltage, QFN-16; ki_fp_filters: Texas*S?PVQFN?N*; Footprint: Package_DFN_QFN:Texas_S-PVQFN-N16_EP2.7x2.7mm_ThermalVias; Datasheet: http://www.ti.com/lit/ds/symlink/tps61090.pdf
pins: 1 VOUT, 2 NC hidden, 3 SW, 4 SW, 5 PGND, 6 PGND, 7 PGND, 8 VBAT, 9 LBI, 10 SYNC, 11 EN, 12 LBO, 13 GND, 14 FB, 15 VOUT, 16 VOUT, 17 PAD

## TPS61091
designator *  value TPS61091  Reference: U
ki_keywords: Fixed 3.3V 2A battery boost converter; ki_description: 2A Step-Up DC-DC Converter for Batteries, Isw up to 2500mA, 3.3V Output Voltage, QFN-16; ki_fp_filters: Texas*S?PVQFN?N*; Footprint: Package_DFN_QFN:Texas_S-PVQFN-N16_EP2.7x2.7mm_ThermalVias; Datasheet: http://www.ti.com/lit/ds/symlink/tps61090.pdf
pins: 1 VOUT, 2 NC hidden, 3 SW, 4 SW, 5 PGND, 6 PGND, 7 PGND, 8 VBAT, 9 LBI, 10 SYNC, 11 EN, 12 LBO, 13 GND, 14 FB, 15 VOUT, 16 VOUT, 17 PAD

## TPS61092
designator *  value TPS61092  Reference: U
ki_keywords: Fixed 5V 2A battery boost converter; ki_description: 2A Step-Up DC-DC Converter for Batteries, Isw up to 2500mA, 5V Output Voltage, QFN-16; ki_fp_filters: Texas*S?PVQFN?N*; Footprint: Package_DFN_QFN:Texas_S-PVQFN-N16_EP2.7x2.7mm_ThermalVias; Datasheet: http://www.ti.com/lit/ds/symlink/tps61090.pdf
pins: 1 VOUT, 2 NC hidden, 3 SW, 4 SW, 5 PGND, 6 PGND, 7 PGND, 8 VBAT, 9 LBI, 10 SYNC, 11 EN, 12 LBO, 13 GND, 14 FB, 15 VOUT, 16 VOUT, 17 PAD
